# Altium footprint library PcbLib1.PcbLib: 17 footprints (part 1 of 2)
Each footprint in its own frame and in the unit in brackets; x right, y up, seen from the top. Pads: shape width x height; smd on the part's side, far side on the other; paste and mask are expansions set on the pad; w line width, h text height; cw(c..) or ccw(c..) is an arc to the next point about the centre after c.
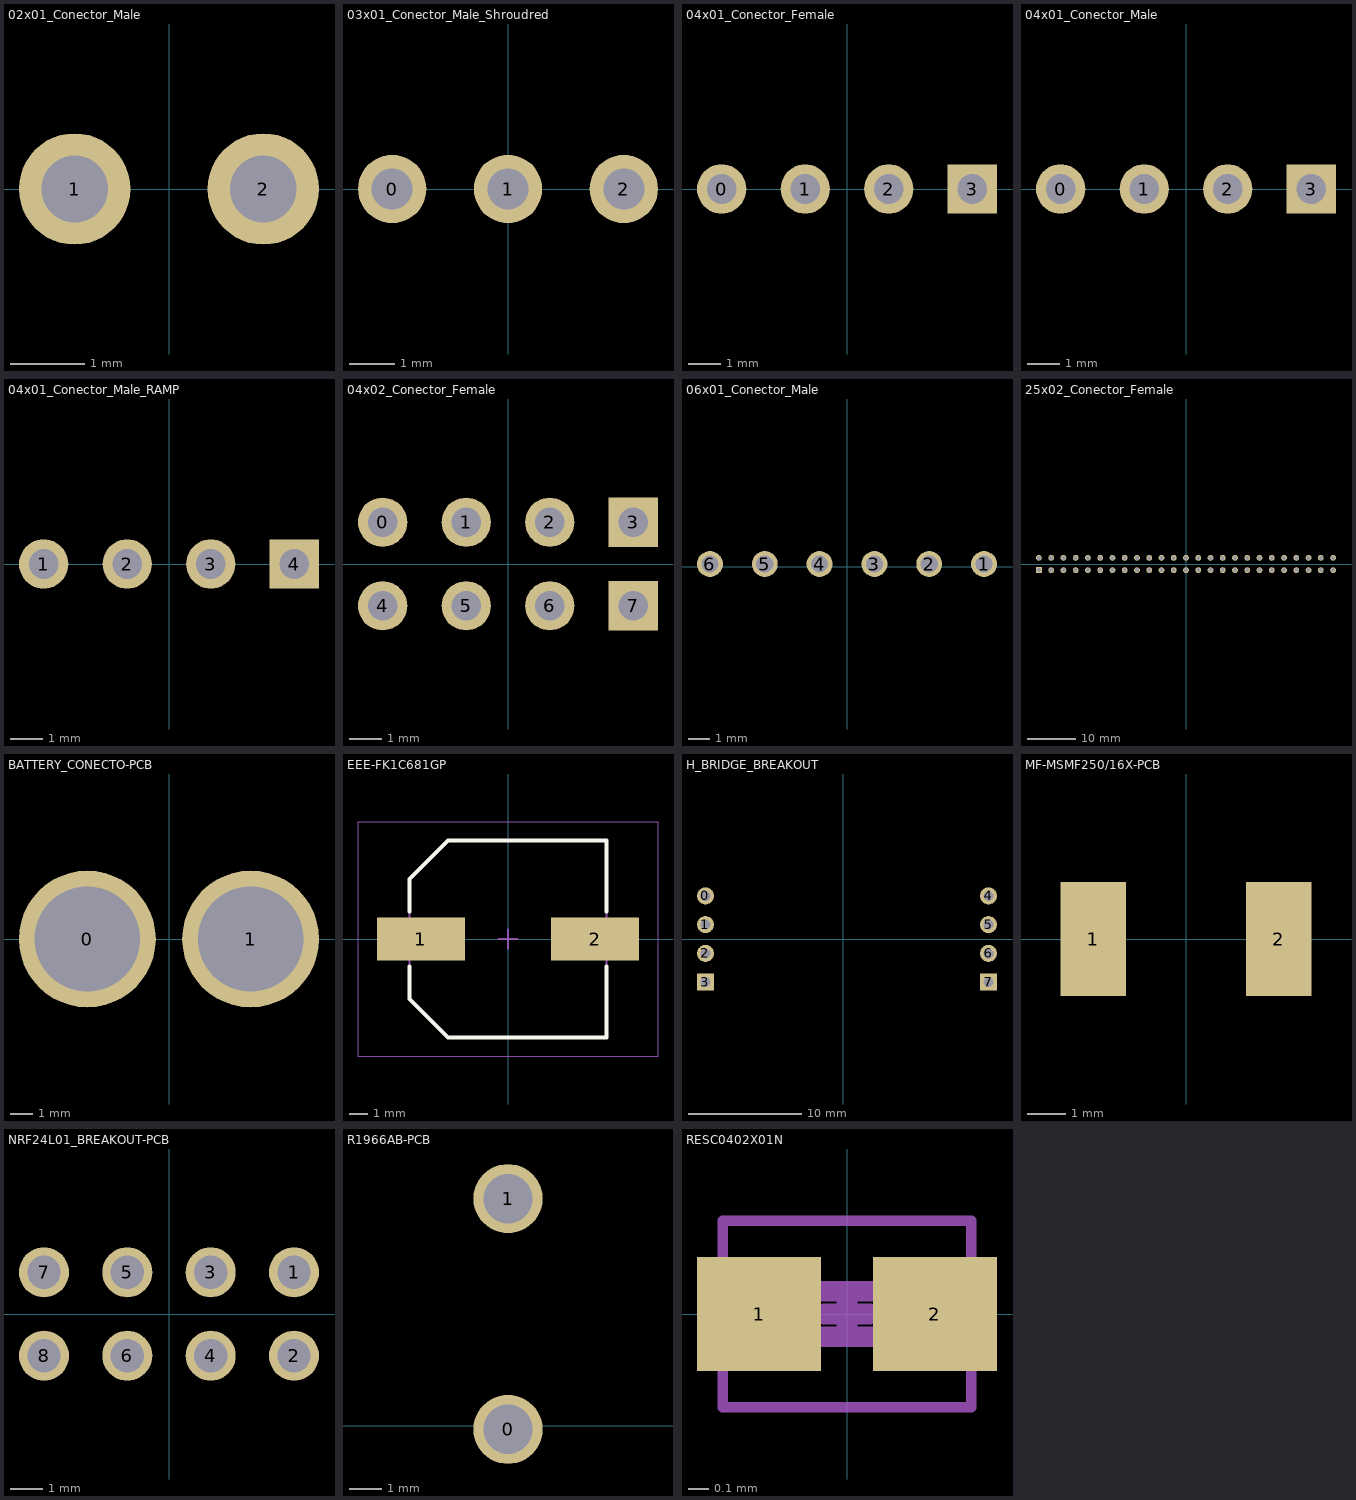
[diagram p0: the footprints below, top view; thin cyan lines are the x and y axes]

## 02x01_Conector_Male [mm] "0022112022"
pads (2):
  round 1.5 hole 0.9: 1(-1.27,0) 2(1.27,0)
3D body "022112022.stp": height 3.14, standoff -11.08, extent -2.464,-3.251 2.464,3.099

## 03x01_Conector_Male_Shroudred [mm] "B3B-XH-A(LF)(SN)"
pads (3):
  round 1.5 hole 0.9: 0(-2.54,0) 1(0,0) 2(2.54,0)
3D body "User Library-XH-3P_2_5_Silver.STEP": height 3.1, standoff -7.4, extent -4.953,-3.383 4.947,2.367

## 04x01_Conector_Female [mm] "PPPC041LFBN-RC"
pads (4):
  round 1.5 hole 0.9: 0(-3.81,0) 1(-1.27,0) 2(1.27,0)
  rect 1.5x1.5 hole 0.9: 3(3.81,0)
3D body "_ _ _C041LFBN-RC.STEP": height 8.5, standoff -3.2, extent -5.33,-1.27 5.33,1.27

## 04x01_Conector_Male [mm] "0022032041"
pads (4):
  round 1.5 hole 0.9: 0(-3.81,0) 1(-1.27,0) 2(1.27,0)
  rect 1.5x1.5 hole 0.9: 3(3.81,0)
3D body "022032041.stp": height 10.84, standoff -3.38, extent -4.953,-1.181 4.953,1.181

## 04x01_Conector_Male_RAMP [mm] "0022232041"
pads (4):
  round 1.5 hole 0.9: 1(-3.81,0) 2(-1.27,0) 3(1.27,0)
  rect 1.5x1.5 hole 0.9: 4(3.81,0)
3D body "022232041.stp": height 3.04, standoff -11.18, extent -5.004,-3.175 5.004,3.175

## 04x02_Conector_Female [mm] "PPPC042LFBN-RC"
pads (8):
  round 1.5 hole 0.9: 0(-3.81,1.27) 1(-1.27,1.27) 2(1.27,1.27) 4(-3.81,-1.27) 5(-1.27,-1.27) 6(1.27,-1.27)
  rect 1.5x1.5 hole 0.9: 3(3.81,1.27) 7(3.81,-1.27)
3D body "_ _ _C042LFBN-RC.STEP": height 8.52, standoff -3.18, extent -5.304,-2.549 5.36,2.531

## 06x01_Conector_Male [mil] "0022112062"
pads (6):
  round 47.25 hole 31.5: 1(250,5) 2(150,5) 3(50,5) 4(-50,5) 5(-150,5) 6(-250,5)
3D body "022112062.stp": height 123.76, standoff -436.24, extent -297,-115 297,135

## 25x02_Conector_Female [mil] "SFH11-PBPC-D25-ST-BK"
pads (50):
  rect 47.25x47.25 hole 31.5: 1(-1200,-50)
  round 47.25 hole 31.5: 2(-1200,50) 3(-1100,-50) 4(-1100,50) 5(-1000,-50) 6(-1000,50) 7(-900,-50) 8(-900,50) 9(-800,-50) 10(-800,50) 11(-700,-50) 12(-700,50) 13(-600,-50) 14(-600,50) 15(-500,-50) 16(-500,50) 17(-400,-50) 18(-400,50) 19(-300,-50) 20(-300,50) 21(-200,-50) 22(-200,50) 23(-100,-50) 24(-100,50) 25(0,-50) 26(0,50) 27(100,-50) 28(100,50) 29(200,-50) 30(200,50) 31(300,-50) 32(300,50) 33(400,-50) 34(400,50) 35(500,-50) 36(500,50) 37(600,-50) 38(600,50) 39(700,-50) 40(700,50) 41(800,-50) 42(800,50) 43(900,-50) 44(900,50) 45(1000,-50) 46(1000,50) 47(1100,-50) 48(1100,50) 49(1200,-50) 50(1200,50)
3D body "SFH11-P_ _C-D25-ST-_ _-M181.STEP": height 332.68, standoff -127.95, extent -1350,-121.22 1350,115

## BATTERY_CONECTO-PCB [mm]
pads (2):
  round 6 hole 4.62: 0(-3.58,0) 1(3.58,0)
3D body "User Library-XT60 male.STEP": height 16.4, standoff -4.8, extent -7.823,-4.191 8.077,3.959

## EEE-FK1C681GP [mm] "Aluminum Electrolytic Capacitor, Body 10,30x10,30x10,50mm, IPC Low Density"
height 10.5
pads (2):
  rect 4.7x2.3 smd: 1(-4.65,0) 2(4.65,0)
Top Overlay:
  lines w0.2: -5.25,-1.45 -5.25,-3.2 -3.2,-5.25 5.25,-5.25 5.25,-1.45 ; -5.25,1.45 -5.25,3.2 -3.2,5.25 5.25,5.25 5.25,1.45
Mechanical 13:
  lines w0.1: -5.25,-3.2 -5.25,3.2 -3.2,5.25 5.25,5.25 5.25,-5.25 -3.2,-5.25 -5.25,-3.2
Mechanical 15:
  lines w0.05: -8,-6.25 8,-6.25 8,6.25 -8,6.25 -8,-6.25
  lines w0.1: -0.5,0 0.5,0 ; 0,-0.5 0,0.5
3D body "SW3dPS-capg.STEP": height 10.41, standoff -0.05, extent -5.65,-5.207 5.65,5.093

## H_BRIDGE_BREAKOUT [mm]
pads (8):
  round 1.5 hole 0.9: 0(-12.173,3.81) 1(-12.173,1.27) 2(-12.173,-1.27) 4(12.827,3.81) 5(12.827,1.27) 6(12.827,-1.27)
  rect 1.5x1.5 hole 0.9: 3(-12.173,-3.81) 7(12.827,-3.81)
3D body "motor_driver.step": height 9.95, standoff -4.34, extent -13.824,-7.112 14.354,6.985

## MF-MSMF250/16X-PCB [mm] "Chip PTC RESETTABLE"
height 0.85
pads (2):
  rect 1.68x2.95 smd: 1(-2.39,0) 2(2.39,0)
3D body "mf-msmf250_16x (2).stp": height 1.15, standoff 0, extent -2.3,-1.62 2.3,1.62

## NRF24L01_BREAKOUT-PCB [mil]
pads (8):
  round 60 hole 40.16: 1(150,50) 2(150,-50) 3(50,50) 4(50,-50) 5(-50,50) 6(-50,-50) 7(-150,50) 8(-150,-50)

## PCBComponent_1 - duplicate [mil]

## R1966AB-PCB [mm] "SWITCH ROCKER SPST 15A 125V"
pads (2):
  round 2.1 hole 1.5: 0(10.541,-0.117)
  round 2.1 hole 1.5 paste+0: 1(10.541,6.883)
3D body "R1966ABLKBLKFR.stp": height 15.6, standoff -3.8, extent -11.377,-10.668 11.123,10.276

## RESC0402X01N [mm] "Chip Resistor, 2-Leads, Body 0,40x0,20mm, IPC Medium Density"
height 0.13
pads (2):
  rect 0.6x0.55 smd: 1(-0.425,0) 2(0.425,0)
Mechanical 13:
  lines w0.1: -0.21,-0.11 -0.21,0.11 0.21,0.11 0.21,-0.11 -0.21,-0.11
Mechanical 15:
  lines w0.05: -0.6,-0.45 -0.6,0.45 0.6,0.45 0.6,-0.45 -0.6,-0.45
  lines w0.1: -0.11,0 0.11,0 ; 0,-0.11 0,0.11
3D body: height 0.13, standoff 0, extent -0.21,-0.11 0.21,0.11
3D body: height 0.13, standoff 0, extent -0.21,-0.11 0.21,0.11
3D body: height 0.13, standoff 0, extent -0.21,-0.11 0.21,0.11